# Altium footprint library AUAV_X05.PcbLib: 69 footprints (part 3 of 5)
Each footprint in its own frame and in the unit in brackets; x right, y up, seen from the top. Pads: shape width x height; smd on the part's side, far side on the other; paste and mask are expansions set on the pad; w line width, h text height; cw(c..) or ccw(c..) is an arc to the next point about the centre after c.
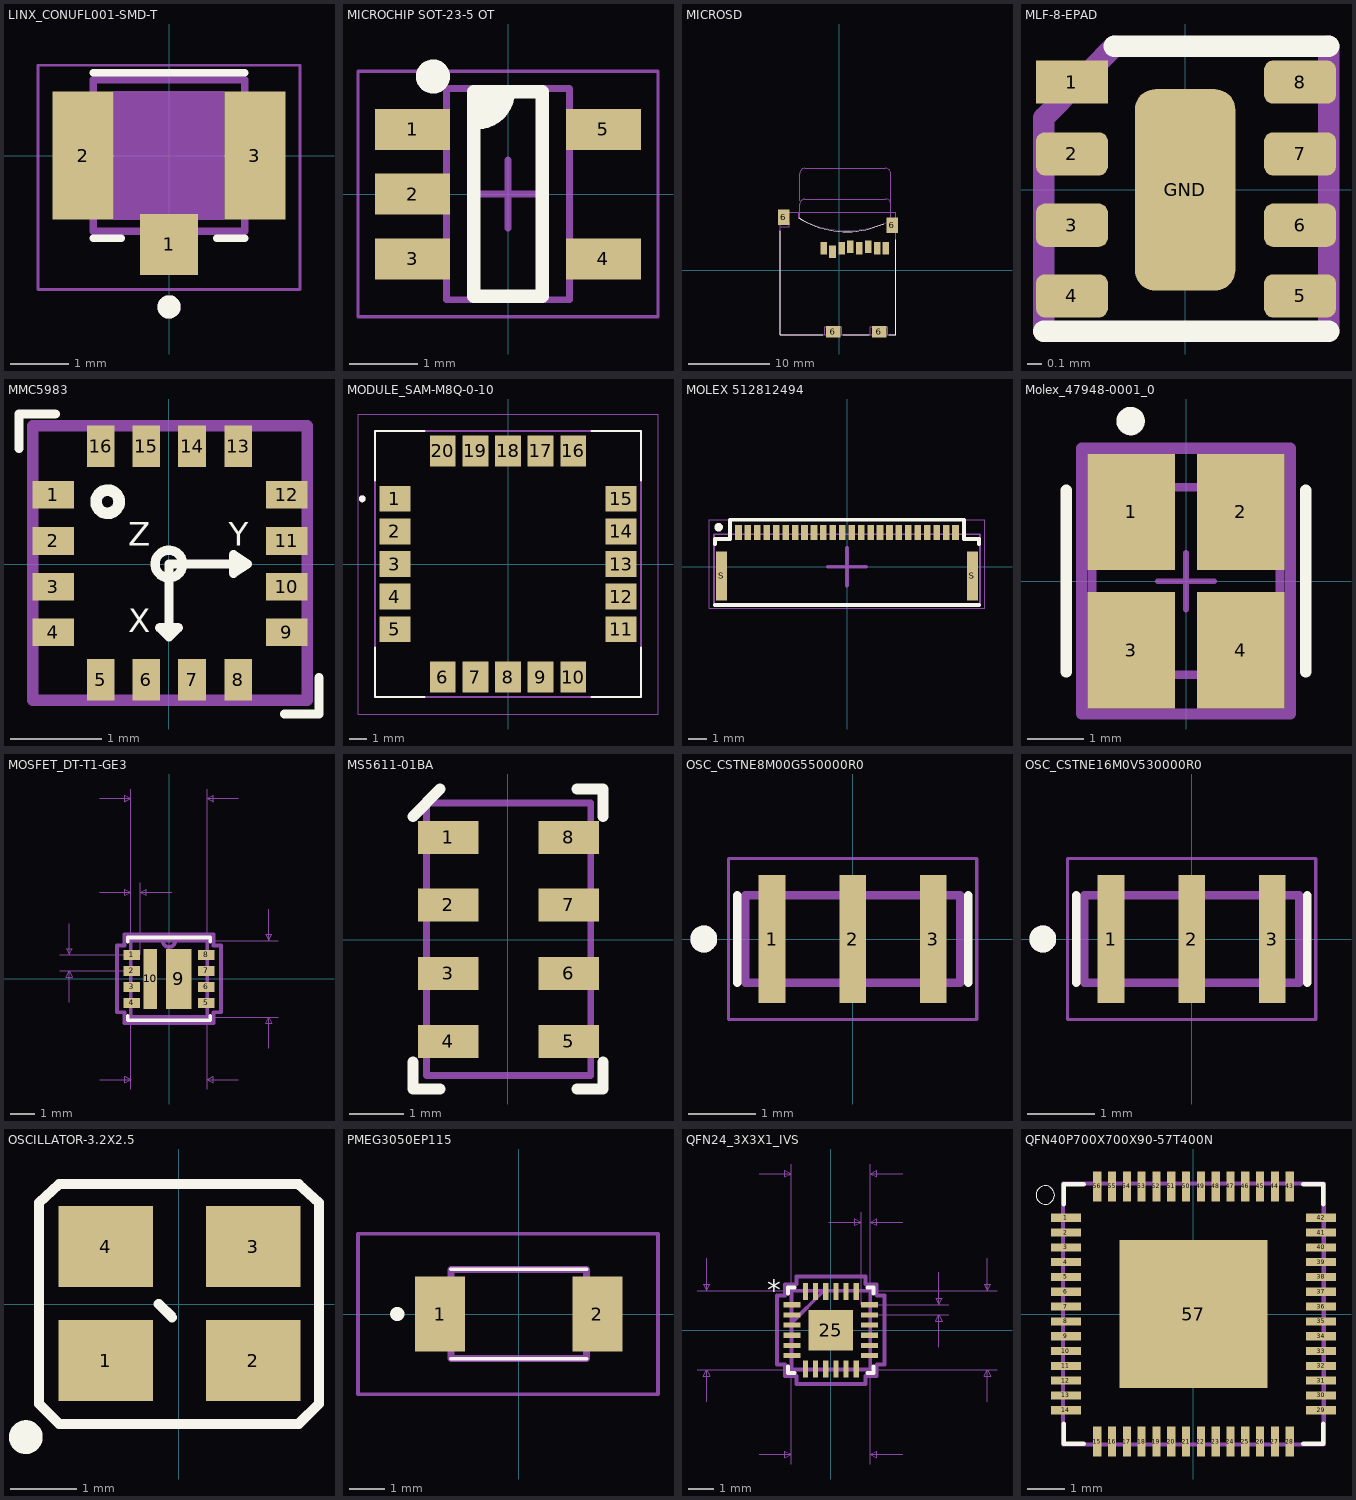
[diagram p2: the footprints below, top view; thin cyan lines are the x and y axes]

## LINX_CONUFL001-SMD-T [mm]
pads (3):
  rect 1x1.05 smd: 1(0,-1.525)
  rect 1.05x2.2 smd: 2(-1.475,0) 3(1.475,0)
Top Overlay:
  circle w0.2: c0,-2.6 r0.1
  lines w0.127: -1.3,-1.42 -0.82,-1.42 ; -1.3,1.42 1.3,1.42 ; 0.82,-1.42 1.3,-1.42
Top 3D Body:
  circle w0.2: c0,-2.6 r0.1
  region: 0.95,-1.1 -0.95,-1.1 -0.95,1.1 0.95,1.1
  lines w0.127: -1.3,-1.3 -1.3,1.3 1.3,1.3 1.3,-1.3 -1.3,-1.3
Mechanical 15:
  lines w0.05: -2.25,-2.3 -2.25,1.55 2.25,1.55 2.25,-2.3 -2.25,-2.3
3D body "step_temp.STEP": height 1.3, standoff 0, extent -1.5,-1.55 1.5,1.55

## MICROCHIP SOT-23-5 OT [mm]
pads (5):
  rect 1.1x0.6 smd: 1(-1.4,0.95) 2(-1.4,0) 3(-1.4,-0.95) 4(1.4,-0.95) 5(1.4,0.95)
Top Overlay:
  circle w0.25: c-1.1,1.725 r0.125
  region: -0.5,1.5 0,1.5 0,1.35 -0.3,1.05 -0.5,1.05
  lines w0.2: -0.5,1.05 -0.45,1.05 ccw(c-0.45,1.5) 0,1.5 ; -0.5,-1.5 -0.5,1.5 0.5,1.5 0.5,-1.5 -0.5,-1.5
Top 3D Body:
  lines w0.1: -0.9,-1.55 0.9,-1.55 0.9,1.55 -0.9,1.55 -0.9,-1.55
Mechanical 15:
  lines w0.05: -2.2,-1.8 2.2,-1.8 2.2,1.8 -2.2,1.8 -2.2,-1.8
  lines w0.1: -0.5,0 0.5,0 ; 0,-0.5 0,0.5
3D body "sot-23-5-microchip.STEP": height 1.19, standoff 0, extent -1.36,-1.45 1.361,1.45

## MICROSD [mil] "MICROSD"
pads (12):
  rect 32x60 smd: 1(-76.38,107) 2(-33.07,91) 3(11,107) 4(54,115) 5(97,107) 6(141,115) 7(184,107) 8(227,107)
  rect 56x75 smd: 6(-269.69,258) 6(258,219)
  rect 71x56 smd: 6(-29.53,-299.21) 6(195,-299.21)
Top Overlay:
  lines w5: -287.4,193 -287.4,-314.96 -80.71,-314.96 ; -196.85,256 ccw(c35.12,618.63) 216,228 ; 17,-314.96 145,-314.96 ; 242,-314.96 276,-314.96 276,150
Mechanical 16:
  lines w0: -192.91,252 -192.91,322 cw(c-167.81,321.9) -167.7,347 225,347 cw(c224.5,319.5) 252,319 252,249 ; -192.91,339 -192.91,471 cw(c-167.31,471.4) -167.7,497 225,497 cw(c224.5,469.5) 252,469 252,331
  lines w4: -287.4,-314.96 -287.4,284 276,284 276,-314.96 -287.4,-314.96
  lines w5: -287.4,-314.96 -70.87,-314.96 -70.87,-275.59 -59.06,-275.59 -59.06,-314.96 -3.94,-314.96 -3.94,-275.59 12,-275.59 12,-314.96 150,-314.96 150,-275.59 162,-275.59 162,-314.96 221,-314.96 221,-275.59 237,-275.59 237,-314.96 276,-314.96 276,249 256,249 252,245 cw(c37.61,660) -196.85,256 -196.85,284 -287.4,284 -287.4,233 -244.09,233 -244.09,213 -287.4,213 -287.4,-314.96
Mechanical 30:
  text "card OUT" at -51.18,457 h49.6
  text "card IN" at -27.56,308 h49.6
3D body "2908-05xx-xx-02.STEP": height 72.83, standoff -1.97, extent -275.59,-315.2 275.59,285.2

## MLF-8-EPAD [mil] "MLF-8-EPAD"
pads (9):
  rect 20x12 smd: 1(-31.5,30)
  rrect40% 20x12 smd: 2(-31.5,10) 3(-31.5,-9.84) 4(-31.5,-29.53) 5(32,-29.53) 6(32,-9.84) 7(32,10) 8(32,30)
  rrect40% 28x56 smd: GND(0,0)
Top Overlay:
  lines w6: -39.37,-39.37 40,-39.37 ; -19.68,40 40,40
Mechanical 16:
  lines w6: -39.37,-39.37 -39.37,20 -19.68,40 ; 40,-39.37 40,40
3D body "MLF-8.step": height 33.46, standoff 0, extent -39.76,-39.37 39.76,39.37

## MMC5983 [mil] "HMC5983"
pads (16):
  rect 18x12 smd: 1(-50.2,30) 2(-50.2,10) 3(-50.2,-9.84) 4(-50.2,-29.53) 9(51,-29.53) 10(51,-9.84) 11(51,10) 12(51,30)
  rect 12x18 smd: 5(-29.53,-50.2) 6(-9.84,-50.2) 7(10,-50.2) 8(30,-50.2) 13(30,51) 14(10,51) 15(-9.84,51) 16(-29.53,51)
Top Overlay:
  circle w5: c-26.57,27 r5
  circle w4: c0,0 r6
  lines w4: -64.96,50 -64.96,65 -49.21,65 ; 50,-64.96 65,-64.96 65,-49.21 ; 0,-31.5 0,0 34,0 ; 0,-31.5 4,-27.56 -3.94,-27.56 0,-31.5 ; 34,0 28,4 28,-3.94 34,0
  text "X" at -17.72,-29.53 h10.2
  text "Y" at 26,8 h10.2
  text "Z" at -17.72,8 h10.2
Mechanical 16:
  lines w5: -59.06,-59.06 60,-59.06 ; -59.06,-59.06 -59.06,60 ; -59.06,-59.06 60,-59.06 ; -59.06,-59.06 -59.06,60 ; -59.06,60 60,60 ; -59.06,60 60,60 ; 60,-59.06 60,60 ; 60,-59.06 60,60
3D body "HMC5983.STEP": height 35.43, standoff 0, extent -59,-58.88 60.77,60.88

## MODULE_SAM-M8Q-0-10 [mm]
pads (20):
  rect 1.8x1.5 smd paste-2 mask+0: 1(-6.6,3.8) 2(-6.6,1.9) 3(-6.6,0) 4(-6.6,-1.9) 5(-6.6,-3.8) 11(6.6,-3.8) 12(6.6,-1.9) 13(6.6,0) 14(6.6,1.9) 15(6.6,3.8)
  rect 1.5x1.8 smd paste-2 mask+0: 6(-3.8,-6.6) 7(-1.9,-6.6) 8(0,-6.6) 9(1.9,-6.6) 10(3.8,-6.6) 16(3.8,6.6) 17(1.9,6.6) 18(0,6.6) 19(-1.9,6.6) 20(-3.8,6.6)
Top Overlay:
  circle w0.2: c-8.5,3.8 r0.1
  lines w0.127: -7.75,-4.87 -7.75,-7.75 -4.87,-7.75 ; -7.75,4.87 -7.75,7.75 -4.87,7.75 ; 4.87,-7.75 7.75,-7.75 7.75,-4.87 ; 4.87,7.75 7.75,7.75 7.75,4.87
Top Paste:
  drawing of 80 lines, arcs and shapes, not listed
Top Solder:
  region: -5.7,3.05 -7.5,3.05 -7.5,4.55 -5.7,4.55
  region: -3.05,5.7 -4.55,5.7 -4.55,7.5 -3.05,7.5
  region: -5.7,1.15 -7.5,1.15 -7.5,2.65 -5.7,2.65
  region: -5.7,-0.75 -7.5,-0.75 -7.5,0.75 -5.7,0.75
  region: -5.7,-2.65 -7.5,-2.65 -7.5,-1.15 -5.7,-1.15
  region: -5.7,-4.55 -7.5,-4.55 -7.5,-3.05 -5.7,-3.05
  region: 7.5,3.05 5.7,3.05 5.7,4.55 7.5,4.55
  region: 7.5,1.15 5.7,1.15 5.7,2.65 7.5,2.65
  region: 7.5,-0.75 5.7,-0.75 5.7,0.75 7.5,0.75
  region: 7.5,-2.65 5.7,-2.65 5.7,-1.15 7.5,-1.15
  region: 7.5,-4.55 5.7,-4.55 5.7,-3.05 7.5,-3.05
  region: -1.15,5.7 -2.65,5.7 -2.65,7.5 -1.15,7.5
  region: 0.75,5.7 -0.75,5.7 -0.75,7.5 0.75,7.5
  region: 2.65,5.7 1.15,5.7 1.15,7.5 2.65,7.5
  region: 4.55,5.7 3.05,5.7 3.05,7.5 4.55,7.5
  region: -3.05,-7.5 -4.55,-7.5 -4.55,-5.7 -3.05,-5.7
  region: -1.15,-7.5 -2.65,-7.5 -2.65,-5.7 -1.15,-5.7
  region: 0.75,-7.5 -0.75,-7.5 -0.75,-5.7 0.75,-5.7
  region: 2.65,-7.5 1.15,-7.5 1.15,-5.7 2.65,-5.7
  region: 4.55,-7.5 3.05,-7.5 3.05,-5.7 4.55,-5.7
Top 3D Body:
  circle w0.2: c-8.5,3.8 r0.1
  lines w0.127: -7.75,-7.75 -7.75,7.75 7.75,7.75 7.75,-7.75 -7.75,-7.75
  text "NOTE: Paste mask designed for 120 micrometer thick stencil" at -15,-12.5 h0.81
Mechanical 15:
  lines w0.05: -8.75,-8.75 -8.75,8.75 8.75,8.75 8.75,-8.75 -8.75,-8.75
3D body "GPS_sam-m8q.STEP": height 6.3, standoff -0.05, extent -7.753,-7.75 7.747,7.75

## MOLEX 512812494 [mm]
pads (26):
  rect 0.35x0.8 smd: 1(-5.75,1.825) 2(-5.25,1.825) 3(-4.75,1.825) 4(-4.25,1.825) 5(-3.75,1.825) 6(-3.25,1.825) 7(-2.75,1.825) 8(-2.25,1.825) 9(-1.75,1.825) 10(-1.25,1.825) 11(-0.75,1.825) 12(-0.25,1.825) 13(0.25,1.825) 14(0.75,1.825) 15(1.25,1.825) 16(1.75,1.825) 17(2.25,1.825) 18(2.75,1.825) 19(3.25,1.825) 20(3.75,1.825) 21(4.25,1.825) 22(4.75,1.825) 23(5.25,1.825) 24(5.75,1.825)
  rect 0.6x2.6 smd: S(-6.65,-0.475) S(6.65,-0.475)
Top Overlay:
  circle w0.254: c-6.8,2.1 r0.1
  lines w0.2: -7,-2.025 7,-2.025 ; -7,1.2 -7,1.475 -6.2,1.475 -6.2,2.5 6.2,2.5 6.2,1.475 7,1.475 7,1.2
Top 3D Body:
  lines w0.1: -7.05,-2.025 7.05,-2.025 7.05,1.725 -7.05,1.725 -7.05,-2.025
Mechanical 15:
  lines w0.05: -7.3,-2.2 7.3,-2.2 7.3,2.5 -7.3,2.5 -7.3,-2.2
  lines w0.2: -1,0 1,0 ; 0,-1 0,1
3D body "Molex - 512812494.step": height 1.2, standoff 0, extent -7.05,-2.025 7.05,2.025

## Molex_47948-0001_0 [mm]
pads (4):
  rect 1.54x2.045 smd paste+0 mask+0: 1(-0.965,1.218) 2(0.965,1.218) 3(-0.965,-1.218) 4(0.965,-1.218)
Top Overlay:
  circle w0.25: c-0.975,2.818 r0.125
  lines w0.2: -2.11,-1.6 -2.11,1.6 ; 2.11,-1.6 2.11,1.6
Mechanical 10:
  lines w0.2: -1.835,-2.34 1.835,-2.34 1.835,2.34 -1.835,2.34 -1.835,-2.34
  text ".Designator" at 0,0 h1
Mechanical 12:
  lines w0.15: -1.65,-1.65 1.65,-1.65 1.65,1.65 -1.65,1.65 -1.65,-1.65
Mechanical 15:
  lines w0.1: -0.5,0 0.5,0 ; 0,-0.5 0,0.5
  lines w0.2: -1.835,-2.34 1.835,-2.34 1.835,2.34 -1.835,2.34 -1.835,-2.34
3D body "Ant_Molex_47948-0001_eec.STEP": height 4, standoff 0, extent -1.57,-1.57 1.57,1.57

## MOSFET_DT-T1-GE3 [mil]
pads (10):
  rect 27x16 smd: 1(-59.5,38.38) 2(-59.5,12.79) 3(-59.5,-12.79) 4(-59.5,-38.38) 5(59.5,-38.38) 6(59.5,-12.79) 7(59.5,12.79) 8(59.5,38.38)
  rect 41x96 smd: 9(15.5,0)
  rect 22x96 smd: 10(-29.78,0)
Top Overlay:
  lines w6: -66,-59.48 -66,-66 66,-66 66,-59.48 ; -66,59.48 -66,66 66,66 66,59.48
Mechanical 1:
  lines w1: -12,61 ccw(c0,61) 12,61 ; -61,-61 -61,61 61,61 61,-61 -61,-61
Mechanical 16:
  lines w1: -174.5,12.79 -59.5,12.79 ; -174.5,38.38 -59.5,38.38 ; -159.5,-37.2 -159.5,12.79 ; -159.5,88.39 -159.5,38.38 ; -111,-161 -61,-161 ; -111,138.38 -61,138.38 ; -111,288.38 -61,288.38 ; -61,-176 -61,-61 ; -61,153.38 -61,38.38 -61,303.38 ; -46,38.38 -46,153.38 ; 4,138.38 -46,138.38 ; 61,-176 61,-61 174.5,-61 ; 61,38.38 61,303.38 ; 61,61 174.5,61 ; 111,-161 61,-161 ; 111,288.38 61,288.38 ; 159.5,-111 159.5,-61 ; 159.5,111 159.5,61 ; -159.5,12.79 -154.5,2.79 -164.5,2.79 -159.5,12.79 ; -159.5,38.38 -154.5,48.38 -164.5,48.38 -159.5,38.38 ; -61,-161 -71,-166 -71,-156 -61,-161 ; -61,138.38 -71,133.38 -71,143.38 -61,138.38 ; -61,288.38 -71,283.38 -71,293.38 -61,288.38 ; -46,138.38 -36,133.38 -36,143.38 -46,138.38 ; 61,-161 71,-166 71,-156 61,-161 ; 61,288.38 71,283.38 71,293.38 61,288.38 ; 159.5,-61 164.5,-71 154.5,-71 159.5,-61 ; 159.5,61 164.5,71 154.5,71 159.5,61
  lines w6: -10.17,61 ccw(c0,61) 10.17,61 ; -83,-53.18 -71,-53.18 -71,-71 71,-71 71,-53.18 83,-53.18 83,53.18 71,53.18 71,71 -71,71 -71,53.18 -83,53.18 -83,-53.18 ; -61,-61 61,-61 61,61 -61,61 -61,-61
  text "0.122in/3.099mm" at 0,-181 h15.62
  text "0.122in/3.099mm" at 179.5,0 h15.62
  text "0.026in/0.65mm" at -179.5,25.59 h15.62
  text "0.015in/0.381mm" at -53.5,158.38 h15.62
  text "0.122in/3.099mm" at 0,308.38 h15.62
  text "Alt 2 Padstyle: A2_Pad" at 0,-621 h31.25
  text "Alt 1 Padstyle: OX60Y90D30P" at 0,-561 h31.25
  text "Heat Tab Padstyle 2: RX22Y96D0T" at 0,-391 h31.25
  text "Heat Tab Padstyle: RX22Y96D0T" at 0,-331 h31.25
  text "Default Padstyle: RX27Y16D0T" at 0,-381 h31.25
3D body "User Library-PQFN8.step": height 30.53, standoff -0.97, extent -64.96,-64.92 64.96,65

## MS5611-01BA [mil] "MS5611-01BA"
pads (8):
  rect 44x24 smd: 1(-43.31,74) 2(-43.31,25) 3(-43.31,-24.61) 4(-43.31,-73.82) 5(44,-73.82) 6(44,-24.61) 7(44,25) 8(44,74)
Top Overlay:
  lines w8: -68.9,-88.58 -68.9,-108.27 -49.21,-108.27 ; -68.9,89 -49.21,109 ; 50,-108.27 69,-108.27 69,-88.58 ; 50,109 69,109 69,89
Mechanical 16:
  lines w1: -59.06,-98.43 60,-98.43 60,99 -59.06,99 -59.06,-98.43
  lines w5: -59.06,-98.43 60,-98.43 60,99 -59.06,99 -59.06,-98.43
3D body "MS5611-01BA03.STEP": height 39.37, standoff -1.97, extent -59.32,-97.97 58.79,98.88

## OSC_CSTNE8M00G550000R0 [mm]
pads (3):
  rect 0.4x1.9 smd: 1(-1.2,0) 2(0,0) 3(1.2,0)
Top Overlay:
  circle w0.2: c-2.22,0 r0.1
  lines w0.127: -1.72,-0.65 -1.72,0.65 ; 1.72,-0.65 1.72,0.65
Top 3D Body:
  circle w0.2: c-2.22,0 r0.1
  lines w0.127: -1.6,-0.65 -1.6,0.65 1.6,0.65 1.6,-0.65 -1.6,-0.65
Mechanical 15:
  lines w0.05: -1.85,-1.2 -1.85,1.2 1.85,1.2 1.85,-1.2 -1.85,-1.2
3D body "step_temp.STEP": height 0.8, standoff 0, extent -1.6,-0.65 1.6,0.65

## OSC_CSTNE16M0V530000R0 [mm]
pads (3):
  rect 0.4x1.9 smd: 1(-1.2,0) 2(0,0) 3(1.2,0)
Top Overlay:
  circle w0.2: c-2.22,0 r0.1
  lines w0.127: -1.72,-0.65 -1.72,0.65 ; 1.72,-0.65 1.72,0.65
Top 3D Body:
  circle w0.2: c-2.22,0 r0.1
  lines w0.127: -1.6,-0.65 1.6,-0.65 1.6,0.65 -1.6,0.65 -1.6,-0.65
Mechanical 15:
  lines w0.05: -1.85,-1.2 1.85,-1.2 1.85,1.2 -1.85,1.2 -1.85,-1.2
3D body "step_temp.STEP": height 1, standoff 0, extent -1.6,-0.65 1.6,0.65

## OSCILLATOR-3.2X2.5 [mil] "OSCILLATOR-3.2X2.5"
pads (4):
  rect 56x48 smd: 1(-43.31,-33.46) 2(44,-33.46) 3(44,34) 4(-43.31,34)
Top Overlay:
  circle w12: c-90.55,-78.74 r4
  lines w6: -11.81,0 -3.94,-7.87 ; -82.68,-59.06 -82.68,60 -70.87,71 71,71 83,60 83,-59.06 71,-70.87 -70.87,-70.87 -82.68,-59.06
Mechanical 16:
  lines w1: -82.68,-59.06 -82.68,60 -70.87,71 71,71 83,60 83,-59.06 71,-70.87 -70.87,-70.87 -82.68,-59.06
3D body "ECS-240-18-33-JGN-TR.STEP": height 31.5, standoff 0, extent -62.98,-49.21 63,49.22

## PMEG3050EP115 [mm]
pads (2):
  rect 1.4x2.1 smd: 1(-2.2,0) 2(2.2,0)
Top Overlay:
  lines w0.1: -1.9,-1.25 1.9,-1.25 ; -1.9,1.25 1.9,1.25
  lines w0.2: -3.4,-0.1 ccw(c-3.4,0) -3.4,0.1 ccw(c-3.4,0) -3.4,-0.1
Top 3D Body:
  lines w0.2: -1.9,-1.25 1.9,-1.25 1.9,1.25 -1.9,1.25 -1.9,-1.25
Mechanical 15:
  lines w0.1: -4.5,-2.25 3.9,-2.25 3.9,2.25 -4.5,2.25 -4.5,-2.25
3D body "PMEG3050BEP.stp": height 1.07, standoff 0, extent -2.366,-1.305 2.334,1.295

## QFN24_3X3X1_IVS [mil]
pads (25):
  rect 26x8 smd: 1(-60,39.37) 2(-60,23.62) 3(-60,7.87) 4(-60,-7.87) 5(-60,-23.62) 6(-60,-39.37) 13(60,-39.37) 14(60,-23.62) 15(60,-7.87) 16(60,7.87) 17(60,23.62) 18(60,39.37)
  rect 8x26 smd: 7(-39.37,-60) 8(-23.62,-60) 9(-7.87,-60) 10(7.87,-60) 11(23.62,-60) 12(39.37,-60) 19(39.37,60) 20(23.62,60) 21(7.87,60) 22(-7.87,60) 23(-23.62,60) 24(-39.37,60)
  rect 69x63 smd: 25(0,0)
Top Overlay:
  lines w6: -66,-56.47 -66,-66 -56.47,-66 ; -66,56.47 -66,66 -56.47,66 ; 56.47,-66 66,-66 66,-56.47 ; 56.47,66 66,66 66,56.47
  text "*" at -98,47.24 h31.25
Dimensions:
  lines w1: -61,11 -11,61 ; -61,-61 -61,61 61,61 61,-61 -61,-61 ; -61,-44.37 -61,-34.37 -61,-44.37 ; -61,-28.62 -61,-18.62 -61,-28.62 ; -61,-12.87 -61,-2.87 -61,-12.87 ; -61,2.87 -61,12.87 -61,2.87 ; -61,18.62 -61,28.62 -61,18.62 ; -61,34.37 -61,44.37 -61,34.37 ; -44.37,-61 -34.37,-61 -44.37,-61 ; -44.37,61 -34.37,61 -44.37,61 ; -28.62,-61 -18.62,-61 -28.62,-61 ; -28.62,61 -18.62,61 -28.62,61 ; -12.87,-61 -2.87,-61 -12.87,-61 ; -12.87,61 -2.87,61 -12.87,61 ; 2.87,-61 12.87,-61 2.87,-61 ; 2.87,61 12.87,61 2.87,61 ; 18.62,-61 28.62,-61 18.62,-61 ; 18.62,61 28.62,61 18.62,61 ; 34.37,-61 44.37,-61 34.37,-61 ; 34.37,61 44.37,61 34.37,61 ; 61,-44.37 61,-34.37 61,-44.37 ; 61,-28.62 61,-18.62 61,-28.62 ; 61,-12.87 61,-2.87 61,-12.87 ; 61,2.87 61,12.87 61,2.87 ; 61,18.62 61,28.62 61,18.62 ; 61,34.37 61,44.37 61,34.37
  text "*" at -47,47.24 h31.25
Mechanical 16:
  lines w1: -207,-61 61,-61 ; -207,61 61,61 61,-207 ; -192,-111 -192,-61 ; -192,111 -192,61 ; -111,-192 -61,-192 ; -111,242 -61,242 ; -61,-207 -61,61 ; -61,39.37 -61,257 ; -3,167 47,167 ; 39.37,-61 257,-61 ; 39.37,61 257,61 ; 47,39.37 47,182 ; 60,23.62 182,23.62 ; 60,39.37 182,39.37 ; 61,182 61,39.37 61,257 ; 111,-192 61,-192 ; 111,167 61,167 ; 111,242 61,242 ; 167,-26.38 167,23.62 ; 167,89.37 167,39.37 ; 242,-111 242,-61 ; 242,111 242,61 ; -192,-61 -187,-71 -197,-71 -192,-61 ; -192,61 -187,71 -197,71 -192,61 ; -61,-192 -71,-197 -71,-187 -61,-192 ; -61,242 -71,237 -71,247 -61,242 ; 47,167 37,162 37,172 47,167 ; 61,-192 71,-197 71,-187 61,-192 ; 61,167 71,162 71,172 61,167 ; 61,242 71,237 71,247 61,242 ; 167,23.62 172,13.62 162,13.62 167,23.62 ; 167,39.37 172,49.37 162,49.37 167,39.37 ; 242,-61 247,-71 237,-71 242,-61 ; 242,61 247,71 237,71 242,61
  lines w6: -61,11 -11,61 ; -83,-53.37 -83,53.37 -71,53.37 -71,71 -53.37,71 -53.37,83 53.37,83 53.37,71 71,71 71,53.37 83,53.37 83,-53.37 71,-53.37 71,-71 53.37,-71 53.37,-83 -53.37,-83 -53.37,-71 -71,-71 -71,-53.37 -83,-53.37 ; -61,-61 61,-61 61,61 -61,61 -61,-61
  text "0.122in/3.099mm" at 0,-212 h15.62
  text "0.122in/3.099mm" at -212,0 h15.62
  text "0.122in/3.099mm" at 262,0 h15.62
  text "0.122in/3.099mm" at 0,262 h15.62
  text "0.014in/0.356mm" at 54,187 h15.62
  text "0.016in/0.4mm" at 187,31.5 h15.62
  text "Alt 2 Padstyle: OX90Y60D30P" at 0,-573 h31.25
  text "Alt 1 Padstyle: OX60Y90D30P" at 0,-513 h31.25
  text "Heat Tab Padstyle: RX69Y63D0T" at 0,-393 h31.25
  text "Default Padstyle: RX8Y26D0T" at 0,-333 h31.25
3D body "QFN24_3X3X1_IVS.step": height 43.11, standoff 0, extent -60.98,-60.98 60.99,60.99

## QFN40P700X700X90-57T400N [mm]
pads (57):
  rect 0.81x0.22 smd: 1(-3.445,2.6) 2(-3.445,2.2) 3(-3.445,1.8) 4(-3.445,1.4) 5(-3.445,1) 6(-3.445,0.6) 7(-3.445,0.2) 8(-3.445,-0.2) 9(-3.445,-0.6) 10(-3.445,-1) 11(-3.445,-1.4) 12(-3.445,-1.8) 13(-3.445,-2.2) 14(-3.445,-2.6) 29(3.445,-2.6) 30(3.445,-2.2) 31(3.445,-1.8) 32(3.445,-1.4) 33(3.445,-1) 34(3.445,-0.6) 35(3.445,-0.2) 36(3.445,0.2) 37(3.445,0.6) 38(3.445,1) 39(3.445,1.4) 40(3.445,1.8) 41(3.445,2.2) 42(3.445,2.6)
  rect 0.22x0.81 smd: 15(-2.6,-3.445) 16(-2.2,-3.445) 17(-1.8,-3.445) 18(-1.4,-3.445) 19(-1,-3.445) 20(-0.6,-3.445) 21(-0.2,-3.445) 22(0.2,-3.445) 23(0.6,-3.445) 24(1,-3.445) 25(1.4,-3.445) 26(1.8,-3.445) 27(2.2,-3.445) 28(2.6,-3.445) 43(2.6,3.445) 44(2.2,3.445) 45(1.8,3.445) 46(1.4,3.445) 47(1,3.445) 48(0.6,3.445) 49(0.2,3.445) 50(-0.2,3.445) 51(-0.6,3.445) 52(-1,3.445) 53(-1.4,3.445) 54(-1.8,3.445) 55(-2.2,3.445) 56(-2.6,3.445)
  rect 4x4 smd: 57(0,0)
Top Overlay:
  circle w0: c-4.004,3.214 r0.25
  lines w0.12: -3.5,-2.964 -3.5,-3.5 -2.964,-3.5 ; -3.5,2.964 -3.5,3.5 -2.964,3.5 ; 2.964,-3.5 3.5,-3.5 3.5,-2.964 ; 2.964,3.5 3.5,3.5 3.5,2.964
Top 3D Body:
  lines w0.12: -3.525,-3.525 3.525,-3.525 3.525,3.525 -3.525,3.525 -3.525,-3.525
3D body "ESP32-S2.STEP": height 0.9, standoff 0, extent -3.5,-3.5 3.5,3.5